# Altium footprint library kalios.PcbLib: 404 footprints (part 8 of 26)
Each footprint in its own frame and in the unit in brackets; x right, y up, seen from the top. Pads: shape width x height; smd on the part's side, far side on the other; paste and mask are expansions set on the pad; w line width, h text height; cw(c..) or ccw(c..) is an arc to the next point about the centre after c.
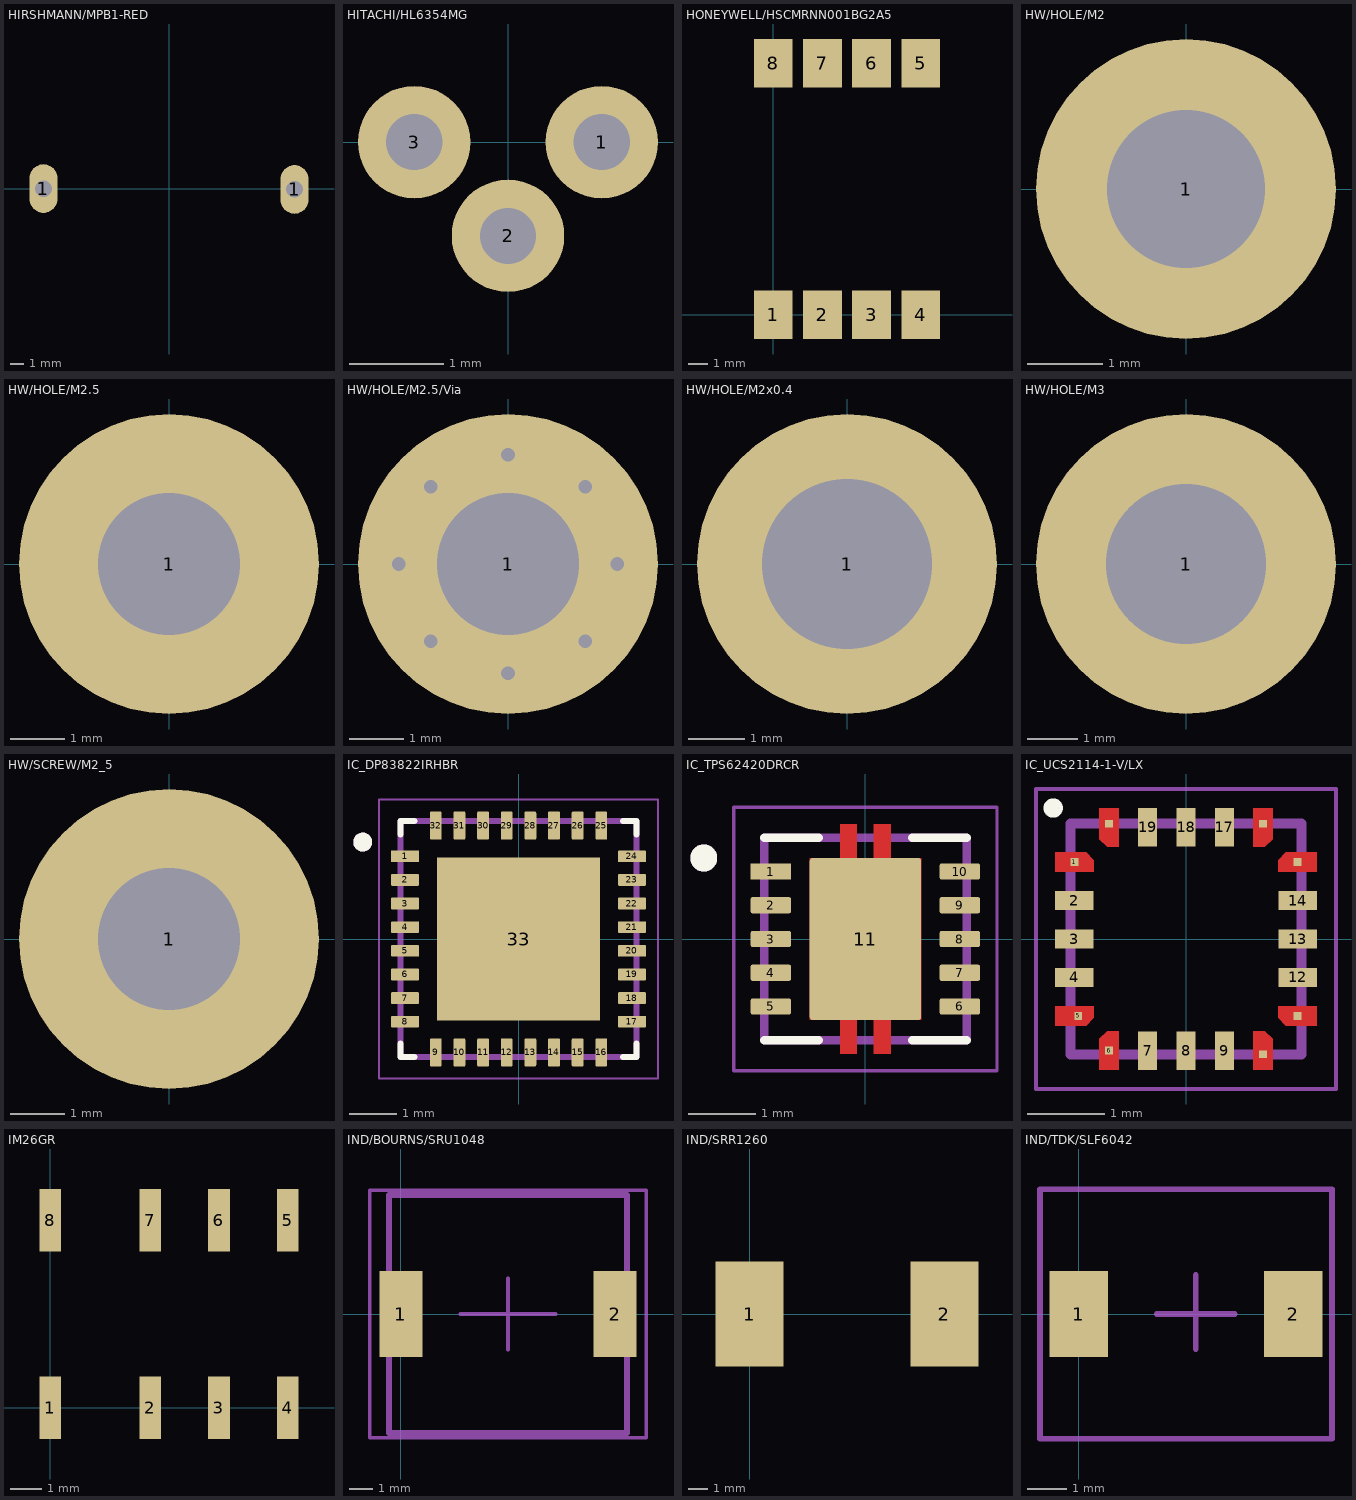
[diagram p7: the footprints below, top view; thin cyan lines are the x and y axes]

## HIRSHMANN/MPB1-RED [mm]
pads (2):
  oval 2x3.5 hole 1.2: 1(-9,0) 1(9,-0.051)
Top Designator:
  text ".Designator" at -6.758,-0.783 h1.52
3D body "MPB1 RED.STEP": height 11.05, standoff -4.55, extent -9.28,-4.275 11.82,3.725

## HITACHI/HL6354MG [mm]
pads (3):
  round 1.2 hole 0.6: 1(1,0) 2(0,-1) 3(-1,0)
Top Designator:
  text ".Designator" at -7.617,-0.497 h1.52
3D body "Hitachi HL6354.STEP": height 3.5, standoff -1.5, extent -2.771,-2.755 2.771,2.777

## HONEYWELL/HSCMRNN001BG2A5 [mm]
pads (8):
  rect 2x2.5 smd: 1(0,0) 2(2.54,0) 3(5.08,0) 4(7.62,0) 5(7.62,13) 6(5.08,13) 7(2.54,13) 8(0,13)
Top Designator:
  text ".Designator" at -5.257,5.992 h1.52
3D body "HSCMRN.STEP": height 8.69, standoff 0.14, extent -4.166,-0.02 8.886,13.28

## HW/HOLE/M2 [mm]
pads (1):
  round 4 hole 2.1: 1(0,0)
Top Designator:
  text ".Designator" at -7.618,-0.508 h1.52

## HW/HOLE/M2.5 [mm]
pads (1):
  round 5.5 / inner round 4 / far side round 5.5 hole 2.6: 1(0,0)
Top Designator:
  text ".Designator" at -7.618,-0.508 h1.52

## HW/HOLE/M2.5/Via [mm]
pads (1):
  round 5.5 hole 2.6: 1(0,0)
via -1.414,-1.414 diameter 0.6 hole 0.25
via 1.414,-1.414 diameter 0.6 hole 0.25
via 1.414,1.414 diameter 0.6 hole 0.25
via -1.414,1.414 diameter 0.6 hole 0.25
via -2,0 diameter 0.6 hole 0.25
via 0,-2 diameter 0.6 hole 0.25
via 2,0 diameter 0.6 hole 0.25
via 0,2 diameter 0.6 hole 0.25
Top Designator:
  text ".Designator" at -7.618,-0.508 h1.52

## HW/HOLE/M2x0.4 [mm]
pads (1):
  round 5.3 hole 3: 1(0,0)
Top Designator:
  text ".Designator" at -7.618,-0.508 h1.52
3D body "9774040243R (rev1).stp": height 4, standoff -1.4, extent -2.175,-2.172 2.175,2.172

## HW/HOLE/M3 [mm]
pads (1):
  round 6 / inner round 4 / far side round 6 hole 3.2: 1(0,0)
Top Designator:
  text ".Designator" at -7.618,-0.508 h1.52

## HW/SCREW/M2_5 [mm]
pads (1):
  round 5.5 / inner round 4 / far side round 4 hole 2.6: 1(0,0)
Top Designator:
  text ".Designator" at -7.618,-0.508 h1.52
3D body "M2_5.STEP": height 2.5, standoff -4, extent -2.235,-2.235 2.265,2.265

## IC_DP83822IRHBR [mm]
pads (33):
  rect 0.6x0.25 smd mask+0: 1(-2.4,1.75)
  rrect25% 0.6x0.25 smd mask+0: 2(-2.4,1.25) 3(-2.4,0.75) 4(-2.4,0.25) 5(-2.4,-0.25) 6(-2.4,-0.75) 7(-2.4,-1.25) 8(-2.4,-1.75) 17(2.4,-1.75) 18(2.4,-1.25) 19(2.4,-0.75) 20(2.4,-0.25) 21(2.4,0.25) 22(2.4,0.75) 23(2.4,1.25) 24(2.4,1.75)
  rrect25% 0.25x0.6 smd mask+0: 9(-1.75,-2.4) 10(-1.25,-2.4) 11(-0.75,-2.4) 12(-0.25,-2.4) 13(0.25,-2.4) 14(0.75,-2.4) 15(1.25,-2.4) 16(1.75,-2.4) 25(1.75,2.4) 26(1.25,2.4) 27(0.75,2.4) 28(0.25,2.4) 29(-0.25,2.4) 30(-0.75,2.4) 31(-1.25,2.4) 32(-1.75,2.4)
  rect 3.45x3.45 smd paste-3 mask+0: 33(0,0)
Top Overlay:
  circle w0.2: c-3.295,2.05 r0.1
  lines w0.127: -2.5,-2.205 -2.5,-2.5 -2.205,-2.5 ; -2.5,2.205 -2.5,2.5 -2.205,2.5 ; 2.205,-2.5 2.5,-2.5 2.5,-2.205 ; 2.205,2.5 2.5,2.5 2.5,2.205
Top Paste:
  region: 1.59,-1.59 0.1,-1.59 0.1,-0.1 1.59,-0.1
  region: -0.1,-1.59 -1.59,-1.59 -1.59,-0.1 -0.1,-0.1
  region: 1.59,0.1 0.1,0.1 0.1,1.59 1.59,1.59
  region: -0.1,0.1 -1.59,0.1 -1.59,1.59 -0.1,1.59
Top Solder:
  drawing of 33 lines, arcs and shapes, not listed
Top 3D Body:
  circle w0.2: c-3.295,2.05 r0.1
  lines w0.127: -2.5,-2.5 -2.5,2.5 2.5,2.5 2.5,-2.5 -2.5,-2.5
Top Courtyard:
  lines w0.05: -2.95,-2.95 -2.95,2.95 2.95,2.95 2.95,-2.95 -2.95,-2.95
3D body "DP83822IRHBR--3DModel-STEP-56544.STEP": height 1, standoff 0, extent -2.5,-2.5 2.5,2.5

## IC_TPS62420DRCR [mm]
pads (11):
  rect 0.6x0.24 smd mask+0: 1(-1.4,1)
  rrect25% 0.6x0.24 smd mask+0: 2(-1.4,0.5) 3(-1.4,0) 4(-1.4,-0.5) 5(-1.4,-1) 6(1.4,-1) 7(1.4,-0.5) 8(1.4,0) 9(1.4,0.5) 10(1.4,1)
  rrect5% 1.65x2.4 smd paste-2 mask+0: 11(0,0)
Top Layer:
  region: 0.375,1.2 0.825,1.2 0.825,-1.2 0.375,-1.2 0.375,-1.7 0.125,-1.7 0.125,-1.2 -0.125,-1.2 -0.125,-1.7 -0.375,-1.7 -0.375,-1.2 -0.825,-1.2 -0.825,1.2 -0.375,1.2 -0.375,1.7 -0.125,1.7 -0.125,1.2 0.125,1.2 0.125,1.7 0.375,1.7
Top Overlay:
  circle w0.2: c-2.395,1.2 r0.1
  lines w0.127: -1.5,-1.5 -0.695,-1.5 ; -1.5,1.5 -0.695,1.5 ; 0.695,-1.5 1.5,-1.5 ; 0.695,1.5 1.5,1.5
Top Paste:
  region: 0.75,0.1 -0.75,0.1 -0.75,1.16 0.75,1.16
  region: 0.75,-1.16 -0.75,-1.16 -0.75,-0.1 0.75,-0.1
  region: 0.375,1.36 0.125,1.36 0.125,1.7 0.375,1.7
  region: -0.125,1.36 -0.375,1.36 -0.375,1.7 -0.125,1.7
  region: 0.375,-1.7 0.125,-1.7 0.125,-1.36 0.375,-1.36
  region: -0.125,-1.7 -0.375,-1.7 -0.375,-1.36 -0.125,-1.36
Top Solder:
  region: 0.445,1.27 0.895,1.27 0.895,-1.27 0.445,-1.27 0.445,-1.77 0.055,-1.77 0.055,-1.27 -0.055,-1.27 -0.055,-1.77 -0.445,-1.77 -0.445,-1.27 -0.895,-1.27 -0.895,1.27 -0.445,1.27 -0.445,1.77 -0.055,1.77 -0.055,1.27 0.055,1.27 0.055,1.77 0.445,1.77
  region: 1.77,0.81 1.03,0.81 1.03,1.19 1.77,1.19
  region: 1.77,0.31 1.03,0.31 1.03,0.69 1.77,0.69
  region: 1.77,-0.19 1.03,-0.19 1.03,0.19 1.77,0.19
  region: 1.77,-0.69 1.03,-0.69 1.03,-0.31 1.77,-0.31
  region: 1.77,-1.19 1.03,-1.19 1.03,-0.81 1.77,-0.81
  region: -1.03,-1.19 -1.77,-1.19 -1.77,-0.81 -1.03,-0.81
  region: -1.03,-0.69 -1.77,-0.69 -1.77,-0.31 -1.03,-0.31
  region: -1.03,-0.19 -1.77,-0.19 -1.77,0.19 -1.03,0.19
  region: -1.03,0.31 -1.77,0.31 -1.77,0.69 -1.03,0.69
  region: -1.03,0.81 -1.77,0.81 -1.77,1.19 -1.03,1.19
Top 3D Body:
  circle w0.2: c-2.395,1.2 r0.1
  lines w0.127: -1.5,-1.5 -1.5,1.5 1.5,1.5 1.5,-1.5 -1.5,-1.5
Top Courtyard:
  lines w0.05: -1.95,-1.95 -1.95,1.95 1.95,1.95 1.95,-1.95 -1.95,-1.95
3D body "TPS62420DRCR.STEP": height 1, standoff 0, extent -1.5,-1.5 1.5,1.5

## IC_UCS2114-1-V/LX [mm]
pads (20):
  rect 0.1x0.1 smd paste-1 mask+0: 1(-1.45,1) 5(-1.4,-1) 6(-1,-1.45) 10(1,-1.5) 11(1.45,-1) 15(1.45,1) 16(1,1.5) 20(-1,1.5)
  rect 0.5x0.25 smd paste-1: 2(-1.45,0.5) 3(-1.45,0) 4(-1.45,-0.5) 12(1.45,-0.5) 13(1.45,0) 14(1.45,0.5)
  rect 0.25x0.5 smd paste-1: 7(-0.5,-1.45) 8(0,-1.45) 9(0.5,-1.45) 17(0.5,1.45) 18(0,1.45) 19(-0.5,1.45)
Top Layer:
  region: -1.2,1.025 -1.2,0.875 -1.7,0.875 -1.7,1.125 -1.3,1.125
  region: -0.875,1.2 -1.025,1.2 -1.125,1.3 -1.125,1.7 -0.875,1.7
  region: -0.875,-1.7 -1.125,-1.7 -1.125,-1.3 -1.025,-1.2 -0.875,-1.2
  region: -1.2,-1.025 -1.3,-1.125 -1.7,-1.125 -1.7,-0.875 -1.2,-0.875
  region: 1.7,-1.125 1.3,-1.125 1.2,-1.025 1.2,-0.875 1.7,-0.875
  region: 1.125,-1.3 1.125,-1.7 0.875,-1.7 0.875,-1.2 1.025,-1.2
  region: 1.125,1.3 1.025,1.2 0.875,1.2 0.875,1.7 1.125,1.7
  region: 1.7,0.875 1.2,0.875 1.2,1.025 1.3,1.125 1.7,1.125
Top Overlay:
  circle w0.2: c-1.727,1.702 r0.025
Top Paste:
  region: 1.65,-0.125 1.2,-0.125 1.2,0.125 1.65,0.125
  region: -0.875,1.25 -1.025,1.25 -1.125,1.35
  region: -0.875,1.2 -1.025,1.2 -1.125,1.3 -1.125,1.65 -0.875,1.65
  region: -1.2,1.025 -1.2,0.875 -1.65,0.875 -1.65,1.125 -1.3,1.125
  region: -1.2,-1.025 -1.3,-1.125 -1.65,-1.125 -1.65,-0.875 -1.2,-0.875
  region: -0.875,-1.65 -1.125,-1.65 -1.125,-1.3 -1.025,-1.2 -0.875,-1.2
  region: 1.125,-1.3 1.125,-1.65 0.875,-1.65 0.875,-1.2 1.025,-1.2
  region: 1.65,-1.125 1.3,-1.125 1.2,-1.025 1.2,-0.875 1.65,-0.875
  region: 1.65,0.875 1.2,0.875 1.2,1.025 1.3,1.125 1.65,1.125
  region: 1.65,0.875 1.35,1.125 1.65,1.125
  region: 1.125,1.3 1.025,1.2 0.875,1.2 0.875,1.65 1.125,1.65
  region: 1.65,-0.625 1.2,-0.625 1.2,-0.375 1.65,-0.375
  region: 1.65,0.375 1.2,0.375 1.2,0.625 1.65,0.625
  region: 0.125,1.2 -0.125,1.2 -0.125,1.65 0.125,1.65
  region: 0.625,1.2 0.375,1.2 0.375,1.65 0.625,1.65
  region: -0.375,1.2 -0.625,1.2 -0.625,1.65 -0.375,1.65
  region: -1.2,-0.125 -1.65,-0.125 -1.65,0.125 -1.2,0.125
  region: -1.2,0.375 -1.65,0.375 -1.65,0.625 -1.2,0.625
  region: -1.2,-0.625 -1.65,-0.625 -1.65,-0.375 -1.2,-0.375
  region: 0.125,-1.65 -0.125,-1.65 -0.125,-1.2 0.125,-1.2
  region: -0.375,-1.65 -0.625,-1.65 -0.625,-1.2 -0.375,-1.2
  region: 0.625,-1.65 0.375,-1.65 0.375,-1.2 0.625,-1.2
Top Solder:
  region: -1.1,1.02 -1.1,0.81 -1.8,0.81 -1.8,1.18 -1.27,1.18
  region: -0.8,1.1 -1.04,1.1 -1.2,1.27 -1.2,1.8 -0.8,1.8
  region: -0.81,-1.8 -1.18,-1.8 -1.18,-1.3 -1.18,-1.27 -1.02,-1.1 -0.81,-1.1
  region: -1.1,-1.04 -1.27,-1.2 -1.8,-1.2 -1.8,-0.8 -1.1,-0.8
  region: 1.8,-1.18 1.27,-1.18 1.1,-1.02 1.1,-0.81 1.8,-0.81
  region: 1.2,-1.27 1.2,-1.8 0.8,-1.8 0.8,-1.1 1.04,-1.1
  region: 1.18,1.3 1.18,1.27 1.02,1.1 0.81,1.1 0.81,1.8 1.18,1.8
  region: 1.8,0.8 1.1,0.8 1.1,1.04 1.27,1.2 1.8,1.2
Top 3D Body:
  lines w0.127: -1.5,-1.5 -1.5,1.5 1.5,1.5 1.5,-1.5 -1.5,-1.5
Top Courtyard:
  lines w0.05: -1.95,-1.95 1.95,-1.95 1.95,1.95 -1.95,1.95 -1.95,-1.95
3D body "step_temp.STEP": height 0.9, standoff 0, extent -1.5,-1.5 1.5,1.5

## IM26GR [mm]
pads (8):
  rect 0.7x2 smd: 1(0,0) 2(3.2,0) 3(5.4,0) 4(7.6,0) 5(7.6,6) 6(5.4,6) 7(3.2,6) 8(0,6)
Top Designator:
  text ".Designator" at -3.833,2.492 h1.52
3D body "IM26GR.STEP": height 5.66, standoff 0, extent -1.215,-0.76 8.785,6.755

## IND/BOURNS/SRU1048 [mm] "TDK Inductor"
pads (2):
  rect 1.8x3.6 smd: 1(0,0) 2(9,0)
Top 3D Body:
  lines w0.254: -0.5,-5 9.5,-5 9.5,5 -0.5,5 -0.5,-5
Top Courtyard:
  lines w0.15: 2.5,0 6.5,0 ; 4.5,-1.5 4.5,1.5 ; -1.3,-5.2 10.3,-5.2 10.3,5.2 -1.3,5.2 -1.3,-5.2
Top Designator:
  text ".Designator" at 1.001,-0.233 h0.7
3D body "User Library-Bourns_SRU1048.STEP": height 5.04, standoff 0, extent -0.479,-5 9.521,5

## IND/SRR1260 [mm]
pads (2):
  rect 3.5x5.4 smd: 1(0,0) 2(10,0)
Top Designator:
  text ".Designator" at -2.618,-0.535 h1.52
3D body "WE-DD-L.STEP": height 6.7, standoff 0, extent -1.221,-6.277 11.279,6.223

## IND/TDK/SLF6042 [mm] "TDK Inductor"
pads (2):
  rect 1.5x2.2 smd: 1(0,0) 2(5.5,0)
Top Courtyard:
  lines w0.15: 2,0 4,0 ; 3,-0.9 3,1 ; -1,-3.2 -1,3.2 6.5,3.2 6.5,-3.2 -1,-3.2
Top Designator:
  text ".Designator" at -4.868,-0.508 h1.52
3D body "User Library-TDK - SLF6045.STEP": height 4.5, standoff 0, extent -0.257,-3 5.743,3